# Altium footprint library ref-packages.PCBLIB: 1543 footprints (part 44 of 103)
Each footprint in its own frame and in the unit in brackets; x right, y up, seen from the top. Pads: shape width x height; smd on the part's side, far side on the other; paste and mask are expansions set on the pad; w line width, h text height; cw(c..) or ccw(c..) is an arc to the next point about the centre after c.
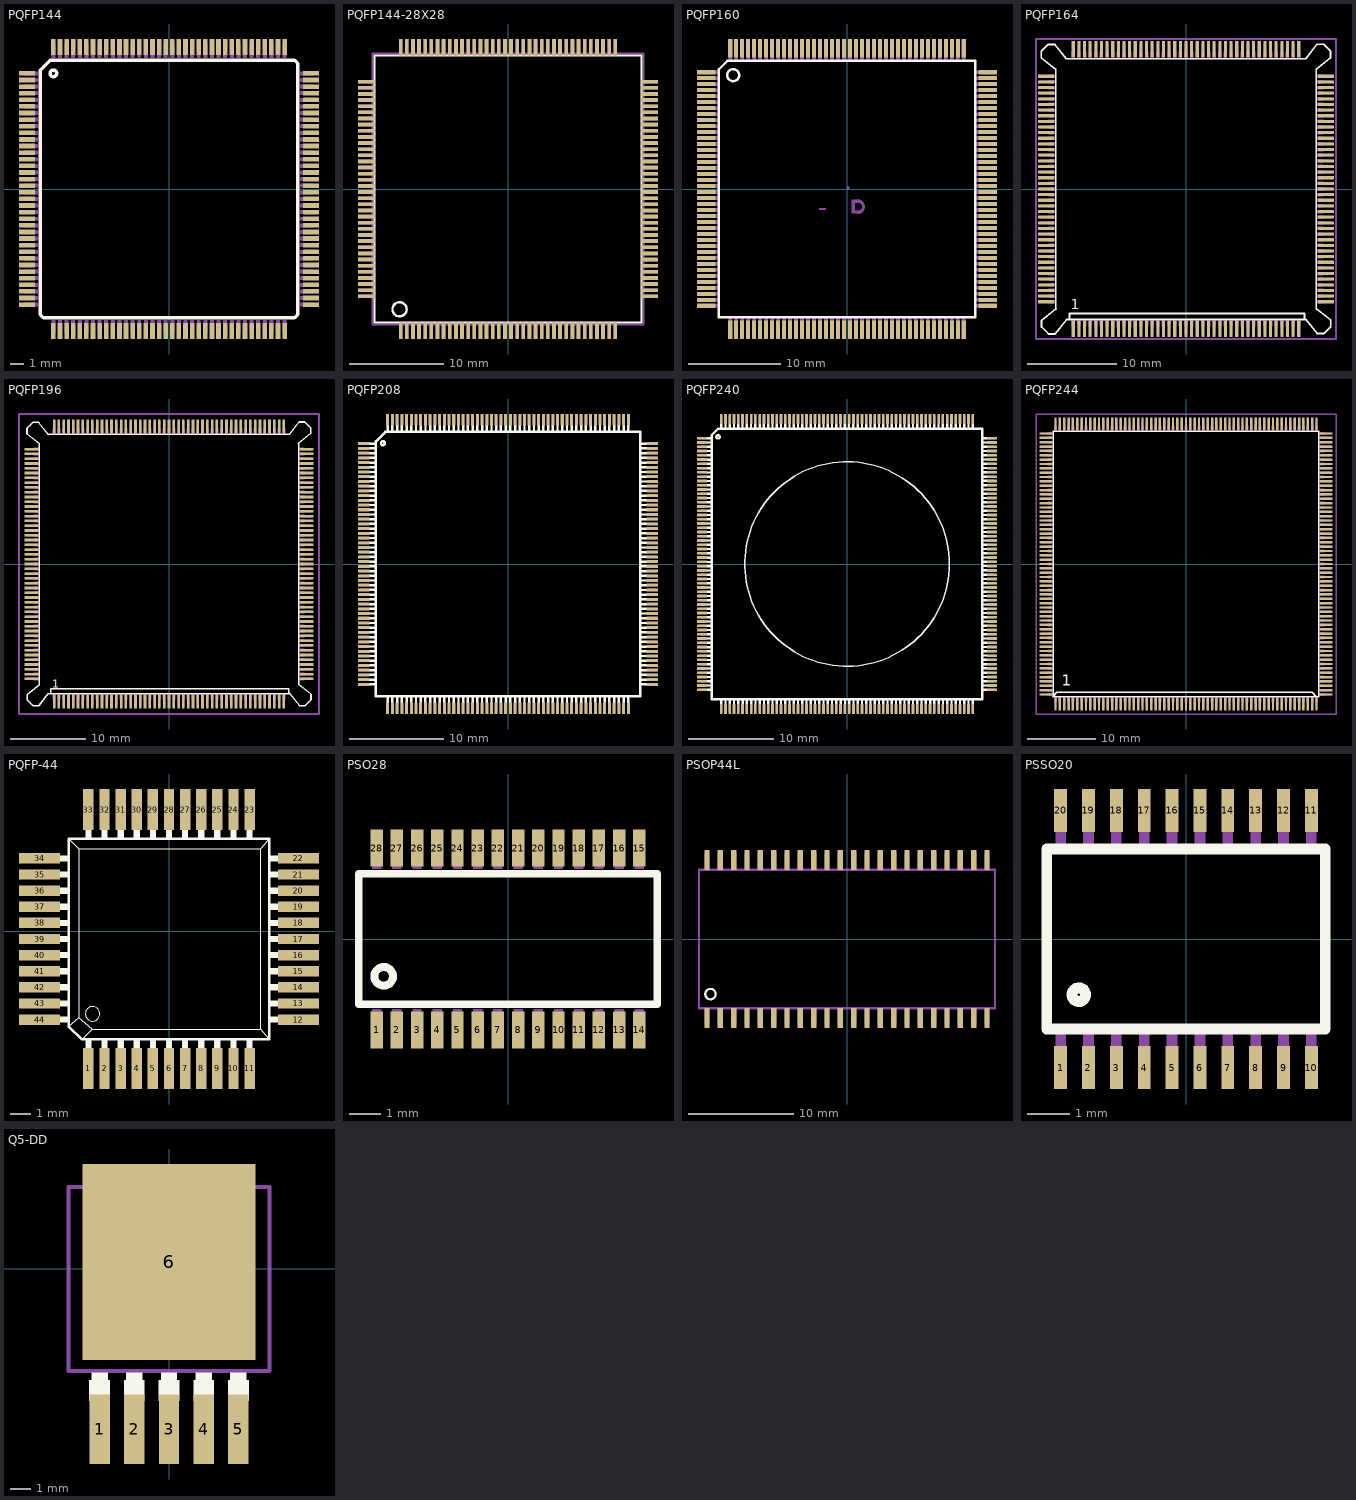
[diagram p43: the footprints below, top view; thin cyan lines are the x and y axes]

## PQFP144 [mm]
pads (144):
  rect 1.2x0.35 smd: 1(-10.75,8.75) 2(-10.75,8.25) 3(-10.75,7.75) 4(-10.75,7.25) 5(-10.75,6.75) 6(-10.75,6.25) 7(-10.75,5.75) 8(-10.75,5.25) 9(-10.75,4.75) 10(-10.75,4.25) 11(-10.75,3.75) 12(-10.75,3.25) 13(-10.75,2.75) 14(-10.75,2.25) 15(-10.75,1.75) 16(-10.75,1.25) 17(-10.75,0.75) 18(-10.75,0.25) 19(-10.75,-0.25) 20(-10.75,-0.75) 21(-10.75,-1.25) 22(-10.75,-1.75) 23(-10.75,-2.25) 24(-10.75,-2.75) 25(-10.75,-3.25) 26(-10.75,-3.75) 27(-10.75,-4.25) 28(-10.75,-4.75) 29(-10.75,-5.25) 30(-10.75,-5.75) 31(-10.75,-6.25) 32(-10.75,-6.75) 33(-10.75,-7.25) 34(-10.75,-7.75) 35(-10.75,-8.25) 36(-10.75,-8.75) 73(10.75,-8.75) 74(10.75,-8.25) 75(10.75,-7.75) 76(10.75,-7.25) 77(10.75,-6.75) 78(10.75,-6.25) 79(10.75,-5.75) 80(10.75,-5.25) 81(10.75,-4.75) 82(10.75,-4.25) 83(10.75,-3.75) 84(10.75,-3.25) 85(10.75,-2.75) 86(10.75,-2.25) 87(10.75,-1.75) 88(10.75,-1.25) 89(10.75,-0.75) 90(10.75,-0.25) 91(10.75,0.25) 92(10.75,0.75) 93(10.75,1.25) 94(10.75,1.75) 95(10.75,2.25) 96(10.75,2.75) 97(10.75,3.25) 98(10.75,3.75) 99(10.75,4.25) 100(10.75,4.75) 101(10.75,5.25) 102(10.75,5.75) 103(10.75,6.25) 104(10.75,6.75) 105(10.75,7.25) 106(10.75,7.75) 107(10.75,8.25) 108(10.75,8.75)
  rect 0.35x1.2 smd: 37(-8.75,-10.75) 38(-8.25,-10.75) 39(-7.75,-10.75) 40(-7.25,-10.75) 41(-6.75,-10.75) 42(-6.25,-10.75) 43(-5.75,-10.75) 44(-5.25,-10.75) 45(-4.75,-10.75) 46(-4.25,-10.75) 47(-3.75,-10.75) 48(-3.25,-10.75) 49(-2.75,-10.75) 50(-2.25,-10.75) 51(-1.75,-10.75) 52(-1.25,-10.75) 53(-0.75,-10.75) 54(-0.25,-10.75) 55(0.25,-10.75) 56(0.75,-10.75) 57(1.25,-10.75) 58(1.75,-10.75) 59(2.25,-10.75) 60(2.75,-10.75) 61(3.25,-10.75) 62(3.75,-10.75) 63(4.25,-10.75) 64(4.75,-10.75) 65(5.25,-10.75) 66(5.75,-10.75) 67(6.25,-10.75) 68(6.75,-10.75) 69(7.25,-10.75) 70(7.75,-10.75) 71(8.25,-10.75) 72(8.75,-10.75) 109(8.75,10.75) 110(8.25,10.75) 111(7.75,10.75) 112(7.25,10.75) 113(6.75,10.75) 114(6.25,10.75) 115(5.75,10.75) 116(5.25,10.75) 117(4.75,10.75) 118(4.25,10.75) 119(3.75,10.75) 120(3.25,10.75) 121(2.75,10.75) 122(2.25,10.75) 123(1.75,10.75) 124(1.25,10.75) 125(0.75,10.75) 126(0.25,10.75) 127(-0.25,10.75) 128(-0.75,10.75) 129(-1.25,10.75) 130(-1.75,10.75) 131(-2.25,10.75) 132(-2.75,10.75) 133(-3.25,10.75) 134(-3.75,10.75) 135(-4.25,10.75) 136(-4.75,10.75) 137(-5.25,10.75) 138(-5.75,10.75) 139(-6.25,10.75) 140(-6.75,10.75) 141(-7.25,10.75) 142(-7.75,10.75) 143(-8.25,10.75) 144(-8.75,10.75)
Top Overlay:
  circle w0.254: c-8.75,8.75 r0.25
  lines w0.254: -9.75,-9.5 -9.5,-9.75 9.5,-9.75 9.75,-9.5 9.75,9.5 9.5,9.75 -9,9.75 -9.75,9 -9.75,-9.5
Mechanical 16:
  rectangle: -10.95,8.6 -9.9,8.9
  rectangle: -10.95,8.1 -9.9,8.4
  rectangle: -10.95,7.6 -9.9,7.9
  rectangle: -10.95,7.1 -9.9,7.4
  rectangle: -10.95,6.6 -9.9,6.9
  rectangle: -10.95,6.1 -9.9,6.4
  rectangle: -10.95,5.6 -9.9,5.9
  rectangle: -10.95,5.1 -9.9,5.4
  rectangle: -10.95,4.6 -9.9,4.9
  rectangle: -10.95,4.1 -9.9,4.4
  rectangle: -10.95,3.6 -9.9,3.9
  rectangle: -10.95,3.1 -9.9,3.4
  rectangle: -10.95,2.6 -9.9,2.9
  rectangle: -10.95,2.1 -9.9,2.4
  rectangle: -10.95,1.6 -9.9,1.9
  rectangle: -10.95,1.1 -9.9,1.4
  rectangle: -10.95,0.6 -9.9,0.9
  rectangle: -10.95,0.1 -9.9,0.4
  rectangle: -10.95,-0.4 -9.9,-0.1
  rectangle: -10.95,-0.9 -9.9,-0.6
  rectangle: -10.95,-1.4 -9.9,-1.1
  rectangle: -10.95,-1.9 -9.9,-1.6
  rectangle: -10.95,-2.4 -9.9,-2.1
  rectangle: -10.95,-2.9 -9.9,-2.6
  rectangle: -10.95,-3.4 -9.9,-3.1
  rectangle: -10.95,-3.9 -9.9,-3.6
  rectangle: -10.95,-4.4 -9.9,-4.1
  rectangle: -10.95,-4.9 -9.9,-4.6
  rectangle: -10.95,-5.4 -9.9,-5.1
  rectangle: -10.95,-5.9 -9.9,-5.6
  rectangle: -10.95,-6.4 -9.9,-6.1
  rectangle: -10.95,-6.9 -9.9,-6.6
  rectangle: -10.95,-7.4 -9.9,-7.1
  rectangle: -10.95,-7.9 -9.9,-7.6
  rectangle: -10.95,-8.4 -9.9,-8.1
  rectangle: -10.95,-8.9 -9.9,-8.6
  rectangle: -8.9,-10.95 -8.6,-9.9
  rectangle: -8.4,-10.95 -8.1,-9.9
  rectangle: -7.9,-10.95 -7.6,-9.9
  rectangle: -7.4,-10.95 -7.1,-9.9
  rectangle: -6.9,-10.95 -6.6,-9.9
  rectangle: -6.4,-10.95 -6.1,-9.9
  rectangle: -5.9,-10.95 -5.6,-9.9
  rectangle: -5.4,-10.95 -5.1,-9.9
  rectangle: -4.9,-10.95 -4.6,-9.9
  rectangle: -4.4,-10.95 -4.1,-9.9
  rectangle: -3.9,-10.95 -3.6,-9.9
  rectangle: -3.4,-10.95 -3.1,-9.9
  rectangle: -2.9,-10.95 -2.6,-9.9
  rectangle: -2.4,-10.95 -2.1,-9.9
  rectangle: -1.9,-10.95 -1.6,-9.9
  rectangle: -1.4,-10.95 -1.1,-9.9
  rectangle: -0.9,-10.95 -0.6,-9.9
  rectangle: -0.4,-10.95 -0.1,-9.9
  rectangle: 0.1,-10.95 0.4,-9.9
  rectangle: 0.6,-10.95 0.9,-9.9
  rectangle: 1.1,-10.95 1.4,-9.9
  rectangle: 1.6,-10.95 1.9,-9.9
  rectangle: 2.1,-10.95 2.4,-9.9
  rectangle: 2.6,-10.95 2.9,-9.9
  rectangle: 3.1,-10.95 3.4,-9.9
  rectangle: 3.6,-10.95 3.9,-9.9
  rectangle: 4.1,-10.95 4.4,-9.9
  rectangle: 4.6,-10.95 4.9,-9.9
  rectangle: 5.1,-10.95 5.4,-9.9
  rectangle: 5.6,-10.95 5.9,-9.9
  rectangle: 6.1,-10.95 6.4,-9.9
  rectangle: 6.6,-10.95 6.9,-9.9
  rectangle: 7.1,-10.95 7.4,-9.9
  rectangle: 7.6,-10.95 7.9,-9.9
  rectangle: 8.1,-10.95 8.4,-9.9
  rectangle: 8.6,-10.95 8.9,-9.9
  rectangle: 9.9,-8.9 10.95,-8.6
  rectangle: 9.9,-8.4 10.95,-8.1
  rectangle: 9.9,-7.9 10.95,-7.6
  rectangle: 9.9,-7.4 10.95,-7.1
  rectangle: 9.9,-6.9 10.95,-6.6
  rectangle: 9.9,-6.4 10.95,-6.1
  rectangle: 9.9,-5.9 10.95,-5.6
  rectangle: 9.9,-5.4 10.95,-5.1
  rectangle: 9.9,-4.9 10.95,-4.6
  rectangle: 9.9,-4.4 10.95,-4.1
  rectangle: 9.9,-3.9 10.95,-3.6
  rectangle: 9.9,-3.4 10.95,-3.1
  rectangle: 9.9,-2.9 10.95,-2.6
  rectangle: 9.9,-2.4 10.95,-2.1
  rectangle: 9.9,-1.9 10.95,-1.6
  rectangle: 9.9,-1.4 10.95,-1.1
  rectangle: 9.9,-0.9 10.95,-0.6
  rectangle: 9.9,-0.4 10.95,-0.1
  rectangle: 9.9,0.1 10.95,0.4
  rectangle: 9.9,0.6 10.95,0.9
  rectangle: 9.9,1.1 10.95,1.4
  rectangle: 9.9,1.6 10.95,1.9
  rectangle: 9.9,2.1 10.95,2.4
  rectangle: 9.9,2.6 10.95,2.9
  rectangle: 9.9,3.1 10.95,3.4
  rectangle: 9.9,3.6 10.95,3.9
  rectangle: 9.9,4.1 10.95,4.4
  rectangle: 9.9,4.6 10.95,4.9
  rectangle: 9.9,5.1 10.95,5.4
  rectangle: 9.9,5.6 10.95,5.9
  rectangle: 9.9,6.1 10.95,6.4
  rectangle: 9.9,6.6 10.95,6.9
  rectangle: 9.9,7.1 10.95,7.4
  rectangle: 9.9,7.6 10.95,7.9
  rectangle: 9.9,8.1 10.95,8.4
  rectangle: 9.9,8.6 10.95,8.9
  rectangle: 8.6,9.9 8.9,10.95
  rectangle: 8.1,9.9 8.4,10.95
  rectangle: 7.6,9.9 7.9,10.95
  rectangle: 7.1,9.9 7.4,10.95
  rectangle: 6.6,9.9 6.9,10.95
  rectangle: 6.1,9.9 6.4,10.95
  rectangle: 5.6,9.9 5.9,10.95
  rectangle: 5.1,9.9 5.4,10.95
  rectangle: 4.6,9.9 4.9,10.95
  rectangle: 4.1,9.9 4.4,10.95
  rectangle: 3.6,9.9 3.9,10.95
  rectangle: 3.1,9.9 3.4,10.95
  rectangle: 2.6,9.9 2.9,10.95
  rectangle: 2.1,9.9 2.4,10.95
  rectangle: 1.6,9.9 1.9,10.95
  rectangle: 1.1,9.9 1.4,10.95
  rectangle: 0.6,9.9 0.9,10.95
  rectangle: 0.1,9.9 0.4,10.95
  rectangle: -0.4,9.9 -0.1,10.95
  rectangle: -0.9,9.9 -0.6,10.95
  rectangle: -1.4,9.9 -1.1,10.95
  rectangle: -1.9,9.9 -1.6,10.95
  rectangle: -2.4,9.9 -2.1,10.95
  rectangle: -2.9,9.9 -2.6,10.95
  rectangle: -3.4,9.9 -3.1,10.95
  rectangle: -3.9,9.9 -3.6,10.95
  rectangle: -4.4,9.9 -4.1,10.95
  rectangle: -4.9,9.9 -4.6,10.95
  rectangle: -5.4,9.9 -5.1,10.95
  rectangle: -5.9,9.9 -5.6,10.95
  rectangle: -6.4,9.9 -6.1,10.95
  rectangle: -6.9,9.9 -6.6,10.95
  rectangle: -7.4,9.9 -7.1,10.95
  rectangle: -7.9,9.9 -7.6,10.95
  rectangle: -8.4,9.9 -8.1,10.95
  rectangle: -8.9,9.9 -8.6,10.95
  text "PGE(S-PQFP-G144)" at -3.81,-8.23 h0.94

## PQFP144-28X28 [mm]
pads (144):
  rect 0.4x1.8 smd: 1(-11.375,-15) 2(-10.725,-15) 3(-10.075,-15) 4(-9.425,-15) 5(-8.775,-15) 6(-8.125,-15) 7(-7.475,-15) 8(-6.825,-15) 9(-6.175,-15) 10(-5.525,-15) 11(-4.875,-15) 12(-4.225,-15) 13(-3.575,-15) 14(-2.925,-15) 15(-2.275,-15) 16(-1.625,-15) 17(-0.975,-15) 18(-0.325,-15) 19(0.325,-15) 20(0.975,-15) 21(1.625,-15) 22(2.275,-15) 23(2.925,-15) 24(3.575,-15) 25(4.225,-15) 26(4.875,-15) 27(5.525,-15) 28(6.175,-15) 29(6.825,-15) 30(7.475,-15) 31(8.125,-15) 32(8.775,-15) 33(9.425,-15) 34(10.075,-15) 35(10.725,-15) 36(11.375,-15) 73(11.375,15) 74(10.725,15) 75(10.075,15) 76(9.425,15) 77(8.775,15) 78(8.125,15) 79(7.475,15) 80(6.825,15) 81(6.175,15) 82(5.525,15) 83(4.875,15) 84(4.225,15) 85(3.575,15) 86(2.925,15) 87(2.275,15) 88(1.625,15) 89(0.975,15) 90(0.325,15) 91(-0.325,15) 92(-0.975,15) 93(-1.625,15) 94(-2.275,15) 95(-2.925,15) 96(-3.575,15) 97(-4.225,15) 98(-4.875,15) 99(-5.525,15) 100(-6.175,15) 101(-6.825,15) 102(-7.475,15) 103(-8.125,15) 104(-8.775,15) 105(-9.425,15) 106(-10.075,15) 107(-10.725,15) 108(-11.375,15)
  rect 1.8x0.4 smd: 37(15,-11.375) 38(15,-10.725) 39(15,-10.075) 40(15,-9.425) 41(15,-8.775) 42(15,-8.125) 43(15,-7.475) 44(15,-6.825) 45(15,-6.175) 46(15,-5.525) 47(15,-4.875) 48(15,-4.225) 49(15,-3.575) 50(15,-2.925) 51(15,-2.275) 52(15,-1.625) 53(15,-0.975) 54(15,-0.325) 55(15,0.325) 56(15,0.975) 57(15,1.625) 58(15,2.275) 59(15,2.925) 60(15,3.575) 61(15,4.225) 62(15,4.875) 63(15,5.525) 64(15,6.175) 65(15,6.825) 66(15,7.475) 67(15,8.125) 68(15,8.775) 69(15,9.425) 70(15,10.075) 71(15,10.725) 72(15,11.375) 109(-15,11.375) 110(-15,10.725) 111(-15,10.075) 112(-15,9.425) 113(-15,8.775) 114(-15,8.125) 115(-15,7.475) 116(-15,6.825) 117(-15,6.175) 118(-15,5.525) 119(-15,4.875) 120(-15,4.225) 121(-15,3.575) 122(-15,2.925) 123(-15,2.275) 124(-15,1.625) 125(-15,0.975) 126(-15,0.325) 127(-15,-0.325) 128(-15,-0.975) 129(-15,-1.625) 130(-15,-2.275) 131(-15,-2.925) 132(-15,-3.575) 133(-15,-4.225) 134(-15,-4.875) 135(-15,-5.525) 136(-15,-6.175) 137(-15,-6.825) 138(-15,-7.475) 139(-15,-8.125) 140(-15,-8.775) 141(-15,-9.425) 142(-15,-10.075) 143(-15,-10.725) 144(-15,-11.375)
Top Overlay:
  circle w0.254: c-11.5,-12.75 r0.75
  lines w0.203: -14.17,-14.16 14.16,-14.16 14.16,14.16 -14.17,14.16 -14.17,-14.16
Mechanical 16:
  rectangle: -11.565,-15.9 -11.195,-14.45
  rectangle: -10.915,-15.9 -10.545,-14.45
  rectangle: -10.265,-15.9 -9.895,-14.45
  rectangle: -9.615,-15.9 -9.245,-14.45
  rectangle: -8.965,-15.9 -8.595,-14.45
  rectangle: -8.315,-15.9 -7.945,-14.45
  rectangle: -7.665,-15.9 -7.295,-14.45
  rectangle: -7.015,-15.9 -6.645,-14.45
  rectangle: -6.365,-15.9 -5.995,-14.45
  rectangle: -5.715,-15.9 -5.345,-14.45
  rectangle: -5.065,-15.9 -4.695,-14.45
  rectangle: -4.415,-15.9 -4.045,-14.45
  rectangle: -3.765,-15.9 -3.395,-14.45
  rectangle: -3.115,-15.9 -2.745,-14.45
  rectangle: -2.465,-15.9 -2.095,-14.45
  rectangle: -1.815,-15.9 -1.445,-14.45
  rectangle: -1.165,-15.9 -0.795,-14.45
  rectangle: -0.515,-15.9 -0.145,-14.45
  rectangle: 0.135,-15.9 0.505,-14.45
  rectangle: 0.785,-15.9 1.155,-14.45
  rectangle: 1.435,-15.9 1.805,-14.45
  rectangle: 2.085,-15.9 2.455,-14.45
  rectangle: 2.735,-15.9 3.105,-14.45
  rectangle: 3.385,-15.9 3.755,-14.45
  rectangle: 4.035,-15.9 4.405,-14.45
  rectangle: 4.685,-15.9 5.055,-14.45
  rectangle: 5.335,-15.9 5.705,-14.45
  rectangle: 5.985,-15.9 6.355,-14.45
  rectangle: 6.635,-15.9 7.005,-14.45
  rectangle: 7.285,-15.9 7.655,-14.45
  rectangle: 7.935,-15.9 8.305,-14.45
  rectangle: 8.585,-15.9 8.955,-14.45
  rectangle: 9.235,-15.9 9.605,-14.45
  rectangle: 9.885,-15.9 10.255,-14.45
  rectangle: 10.535,-15.9 10.905,-14.45
  rectangle: 11.185,-15.9 11.555,-14.45
  rectangle: 14.45,-11.565 15.9,-11.195
  rectangle: 14.45,-10.915 15.9,-10.545
  rectangle: 14.45,-10.265 15.9,-9.895
  rectangle: 14.45,-9.615 15.9,-9.245
  rectangle: 14.45,-8.965 15.9,-8.595
  rectangle: 14.45,-8.315 15.9,-7.945
  rectangle: 14.45,-7.665 15.9,-7.295
  rectangle: 14.45,-7.015 15.9,-6.645
  rectangle: 14.45,-6.365 15.9,-5.995
  rectangle: 14.45,-5.715 15.9,-5.345
  rectangle: 14.45,-5.065 15.9,-4.695
  rectangle: 14.45,-4.415 15.9,-4.045
  rectangle: 14.45,-3.765 15.9,-3.395
  rectangle: 14.45,-3.115 15.9,-2.745
  rectangle: 14.45,-2.465 15.9,-2.095
  rectangle: 14.45,-1.815 15.9,-1.445
  rectangle: 14.45,-1.165 15.9,-0.795
  rectangle: 14.45,-0.515 15.9,-0.145
  rectangle: 14.45,0.135 15.9,0.505
  rectangle: 14.45,0.785 15.9,1.155
  rectangle: 14.45,1.435 15.9,1.805
  rectangle: 14.45,2.085 15.9,2.455
  rectangle: 14.45,2.735 15.9,3.105
  rectangle: 14.45,3.385 15.9,3.755
  rectangle: 14.45,4.035 15.9,4.405
  rectangle: 14.45,4.685 15.9,5.055
  rectangle: 14.45,5.335 15.9,5.705
  rectangle: 14.45,5.985 15.9,6.355
  rectangle: 14.45,6.635 15.9,7.005
  rectangle: 14.45,7.285 15.9,7.655
  rectangle: 14.45,7.935 15.9,8.305
  rectangle: 14.45,8.585 15.9,8.955
  rectangle: 14.45,9.235 15.9,9.605
  rectangle: 14.45,9.885 15.9,10.255
  rectangle: 14.45,10.535 15.9,10.905
  rectangle: 14.45,11.185 15.9,11.555
  rectangle: 11.195,14.45 11.565,15.9
  rectangle: 10.545,14.45 10.915,15.9
  rectangle: 9.895,14.45 10.265,15.9
  rectangle: 9.245,14.45 9.615,15.9
  rectangle: 8.595,14.45 8.965,15.9
  rectangle: 7.945,14.45 8.315,15.9
  rectangle: 7.295,14.45 7.665,15.9
  rectangle: 6.645,14.45 7.015,15.9
  rectangle: 5.995,14.45 6.365,15.9
  rectangle: 5.345,14.45 5.715,15.9
  rectangle: 4.695,14.45 5.065,15.9
  rectangle: 4.045,14.45 4.415,15.9
  rectangle: 3.395,14.45 3.765,15.9
  rectangle: 2.745,14.45 3.115,15.9
  rectangle: 2.095,14.45 2.465,15.9
  rectangle: 1.445,14.45 1.815,15.9
  rectangle: 0.795,14.45 1.165,15.9
  rectangle: 0.145,14.45 0.515,15.9
  rectangle: -0.505,14.45 -0.135,15.9
  rectangle: -1.155,14.45 -0.785,15.9
  rectangle: -1.805,14.45 -1.435,15.9
  rectangle: -2.455,14.45 -2.085,15.9
  rectangle: -3.105,14.45 -2.735,15.9
  rectangle: -3.755,14.45 -3.385,15.9
  rectangle: -4.405,14.45 -4.035,15.9
  rectangle: -5.055,14.45 -4.685,15.9
  rectangle: -5.705,14.45 -5.335,15.9
  rectangle: -6.355,14.45 -5.985,15.9
  rectangle: -7.005,14.45 -6.635,15.9
  rectangle: -7.655,14.45 -7.285,15.9
  rectangle: -8.305,14.45 -7.935,15.9
  rectangle: -8.955,14.45 -8.585,15.9
  rectangle: -9.605,14.45 -9.235,15.9
  rectangle: -10.255,14.45 -9.885,15.9
  rectangle: -10.905,14.45 -10.535,15.9
  rectangle: -11.555,14.45 -11.185,15.9
  rectangle: -15.9,11.195 -14.45,11.565
  rectangle: -15.9,10.545 -14.45,10.915
  rectangle: -15.9,9.895 -14.45,10.265
  rectangle: -15.9,9.245 -14.45,9.615
  rectangle: -15.9,8.595 -14.45,8.965
  rectangle: -15.9,7.945 -14.45,8.315
  rectangle: -15.9,7.295 -14.45,7.665
  rectangle: -15.9,6.645 -14.45,7.015
  rectangle: -15.9,5.995 -14.45,6.365
  rectangle: -15.9,5.345 -14.45,5.715
  rectangle: -15.9,4.695 -14.45,5.065
  rectangle: -15.9,4.045 -14.45,4.415
  rectangle: -15.9,3.395 -14.45,3.765
  rectangle: -15.9,2.745 -14.45,3.115
  rectangle: -15.9,2.095 -14.45,2.465
  rectangle: -15.9,1.445 -14.45,1.815
  rectangle: -15.9,0.795 -14.45,1.165
  rectangle: -15.9,0.145 -14.45,0.515
  rectangle: -15.9,-0.505 -14.45,-0.135
  rectangle: -15.9,-1.155 -14.45,-0.785
  rectangle: -15.9,-1.805 -14.45,-1.435
  rectangle: -15.9,-2.455 -14.45,-2.085
  rectangle: -15.9,-3.105 -14.45,-2.735
  rectangle: -15.9,-3.755 -14.45,-3.385
  rectangle: -15.9,-4.405 -14.45,-4.035
  rectangle: -15.9,-5.055 -14.45,-4.685
  rectangle: -15.9,-5.705 -14.45,-5.335
  rectangle: -15.9,-6.355 -14.45,-5.985
  rectangle: -15.9,-7.005 -14.45,-6.635
  rectangle: -15.9,-7.655 -14.45,-7.285
  rectangle: -15.9,-8.305 -14.45,-7.935
  rectangle: -15.9,-8.955 -14.45,-8.585
  rectangle: -15.9,-9.605 -14.45,-9.235
  rectangle: -15.9,-10.255 -14.45,-9.885
  rectangle: -15.9,-10.905 -14.45,-10.535
  rectangle: -15.9,-11.555 -14.45,-11.185
  lines w0.203: -14.36,-14.36 14.36,-14.36 14.36,14.36 -14.36,14.36 -14.36,-14.36

## PQFP160 [mm]
pads (160):
  rect 2x0.45 smd: 1(-15.275,12.675) 2(-15.275,12.025) 3(-15.275,11.375) 4(-15.275,10.725) 5(-15.275,10.075) 6(-15.275,9.425) 7(-15.275,8.775) 8(-15.275,8.125) 9(-15.275,7.475) 10(-15.275,6.825) 11(-15.275,6.175) 12(-15.275,5.525) 13(-15.275,4.875) 14(-15.275,4.225) 15(-15.275,3.575) 16(-15.275,2.925) 17(-15.275,2.275) 18(-15.275,1.625) 19(-15.275,0.975) 20(-15.275,0.325) 21(-15.275,-0.325) 22(-15.275,-0.975) 23(-15.275,-1.625) 24(-15.275,-2.275) 25(-15.275,-2.925) 26(-15.275,-3.575) 27(-15.275,-4.225) 28(-15.275,-4.875) 29(-15.275,-5.525) 30(-15.275,-6.175) 31(-15.275,-6.825) 32(-15.275,-7.475) 33(-15.275,-8.125) 34(-15.275,-8.775) 35(-15.275,-9.425) 36(-15.275,-10.075) 37(-15.275,-10.725) 38(-15.275,-11.375) 39(-15.275,-12.025) 40(-15.275,-12.675) 81(15.275,-12.675) 82(15.275,-12.025) 83(15.275,-11.375) 84(15.275,-10.725) 85(15.275,-10.075) 86(15.275,-9.425) 87(15.275,-8.775) 88(15.275,-8.125) 89(15.275,-7.475) 90(15.275,-6.825) 91(15.275,-6.175) 92(15.275,-5.525) 93(15.275,-4.875) 94(15.275,-4.225) 95(15.275,-3.575) 96(15.275,-2.925) 97(15.275,-2.275) 98(15.275,-1.625) 99(15.275,-0.975) 100(15.275,-0.325) 101(15.275,0.325) 102(15.275,0.975) 103(15.275,1.625) 104(15.275,2.275) 105(15.275,2.925) 106(15.275,3.575) 107(15.275,4.225) 108(15.275,4.875) 109(15.275,5.525) 110(15.275,6.175) 111(15.275,6.825) 112(15.275,7.475) 113(15.275,8.125) 114(15.275,8.775) 115(15.275,9.425) 116(15.275,10.075) 117(15.275,10.725) 118(15.275,11.375) 119(15.275,12.025) 120(15.275,12.675)
  rect 0.45x2 smd: 41(-12.675,-15.275) 42(-12.025,-15.275) 43(-11.375,-15.275) 44(-10.725,-15.275) 45(-10.075,-15.275) 46(-9.425,-15.275) 47(-8.775,-15.275) 48(-8.125,-15.275) 49(-7.475,-15.275) 50(-6.825,-15.275) 51(-6.175,-15.275) 52(-5.525,-15.275) 53(-4.875,-15.275) 54(-4.225,-15.275) 55(-3.575,-15.275) 56(-2.925,-15.275) 57(-2.275,-15.275) 58(-1.625,-15.275) 59(-0.975,-15.275) 60(-0.325,-15.275) 61(0.325,-15.275) 62(0.975,-15.275) 63(1.625,-15.275) 64(2.275,-15.275) 65(2.925,-15.275) 66(3.575,-15.275) 67(4.225,-15.275) 68(4.875,-15.275) 69(5.525,-15.275) 70(6.175,-15.275) 71(6.825,-15.275) 72(7.475,-15.275) 73(8.125,-15.275) 74(8.775,-15.275) 75(9.425,-15.275) 76(10.075,-15.275) 77(10.725,-15.275) 78(11.375,-15.275) 79(12.025,-15.275) 80(12.675,-15.275) 121(12.675,15.275) 122(12.025,15.275) 123(11.375,15.275) 124(10.725,15.275) 125(10.075,15.275) 126(9.425,15.275) 127(8.775,15.275) 128(8.125,15.275) 129(7.475,15.275) 130(6.825,15.275) 131(6.175,15.275) 132(5.525,15.275) 133(4.875,15.275) 134(4.225,15.275) 135(3.575,15.275) 136(2.925,15.275) 137(2.275,15.275) 138(1.625,15.275) 139(0.975,15.275) 140(0.325,15.275) 141(-0.325,15.275) 142(-0.975,15.275) 143(-1.625,15.275) 144(-2.275,15.275) 145(-2.925,15.275) 146(-3.575,15.275) 147(-4.225,15.275) 148(-4.875,15.275) 149(-5.525,15.275) 150(-6.175,15.275) 151(-6.825,15.275) 152(-7.475,15.275) 153(-8.125,15.275) 154(-8.775,15.275) 155(-9.425,15.275) 156(-10.075,15.275) 157(-10.725,15.275) 158(-11.375,15.275) 159(-12.025,15.275) 160(-12.675,15.275)
Top Overlay:
  circle w0.254: c-12.35,12.35 r0.65
  lines w0.254: -13.9,-13.9 13.9,-13.9 13.9,13.9 -13,13.9 -13.9,13 -13.9,-13.9
Mechanical 16:
  drawing of 173 lines, arcs and shapes, not listed
  text "PQFP 160" at -3.96,-9.81 h1.26

## PQFP164 [mm]
pads (164):
  rect 0.35x1.8 smd: 1(-12.7,-15.8) 2(-12.065,-15.8) 3(-11.43,-15.8) 4(-10.795,-15.8) 5(-10.16,-15.8) 6(-9.525,-15.8) 7(-8.89,-15.8) 8(-8.255,-15.8) 9(-7.62,-15.8) 10(-6.985,-15.8) 11(-6.35,-15.8) 12(-5.715,-15.8) 13(-5.08,-15.8) 14(-4.445,-15.8) 15(-3.81,-15.8) 16(-3.175,-15.8) 17(-2.54,-15.8) 18(-1.905,-15.8) 19(-1.27,-15.8) 20(-0.635,-15.8) 21(0,-15.8) 22(0.635,-15.8) 23(1.27,-15.8) 24(1.905,-15.8) 25(2.54,-15.8) 26(3.175,-15.8) 27(3.81,-15.8) 28(4.445,-15.8) 29(5.08,-15.8) 30(5.715,-15.8) 31(6.35,-15.8) 32(6.985,-15.8) 33(7.62,-15.8) 34(8.255,-15.8) 35(8.89,-15.8) 36(9.525,-15.8) 37(10.16,-15.8) 38(10.795,-15.8) 39(11.43,-15.8) 40(12.065,-15.8) 41(12.7,-15.8) 83(12.7,15.8) 84(12.065,15.8) 85(11.43,15.8) 86(10.795,15.8) 87(10.16,15.8) 88(9.525,15.8) 89(8.89,15.8) 90(8.255,15.8) 91(7.62,15.8) 92(6.985,15.8) 93(6.35,15.8) 94(5.715,15.8) 95(5.08,15.8) 96(4.445,15.8) 97(3.81,15.8) 98(3.175,15.8) 99(2.54,15.8) 100(1.905,15.8) 101(1.27,15.8) 102(0.635,15.8) 103(0,15.8) 104(-0.635,15.8) 105(-1.27,15.8) 106(-1.905,15.8) 107(-2.54,15.8) 108(-3.175,15.8) 109(-3.81,15.8) 110(-4.445,15.8) 111(-5.08,15.8) 112(-5.715,15.8) 113(-6.35,15.8) 114(-6.985,15.8) 115(-7.62,15.8) 116(-8.255,15.8) 117(-8.89,15.8) 118(-9.525,15.8) 119(-10.16,15.8) 120(-10.795,15.8) 121(-11.43,15.8) 122(-12.065,15.8) 123(-12.7,15.8)
  rect 1.8x0.35 smd: 42(15.8,-12.7) 43(15.8,-12.065) 44(15.8,-11.43) 45(15.8,-10.795) 46(15.8,-10.16) 47(15.8,-9.525) 48(15.8,-8.89) 49(15.8,-8.255) 50(15.8,-7.62) 51(15.8,-6.985) 52(15.8,-6.35) 53(15.8,-5.715) 54(15.8,-5.08) 55(15.8,-4.445) 56(15.8,-3.81) 57(15.8,-3.175) 58(15.8,-2.54) 59(15.8,-1.905) 60(15.8,-1.27) 61(15.8,-0.635) 62(15.8,0) 63(15.8,0.635) 64(15.8,1.27) 65(15.8,1.905) 66(15.8,2.54) 67(15.8,3.175) 68(15.8,3.81) 69(15.8,4.445) 70(15.8,5.08) 71(15.8,5.715) 72(15.8,6.35) 73(15.8,6.985) 74(15.8,7.62) 75(15.8,8.255) 76(15.8,8.89) 77(15.8,9.525) 78(15.8,10.16) 79(15.8,10.795) 80(15.8,11.43) 81(15.8,12.065) 82(15.8,12.7) 124(-15.8,12.7) 125(-15.8,12.065) 126(-15.8,11.43) 127(-15.8,10.795) 128(-15.8,10.16) 129(-15.8,9.525) 130(-15.8,8.89) 131(-15.8,8.255) 132(-15.8,7.62) 133(-15.8,6.985) 134(-15.8,6.35) 135(-15.8,5.715) 136(-15.8,5.08) 137(-15.8,4.445) 138(-15.8,3.81) 139(-15.8,3.175) 140(-15.8,2.54) 141(-15.8,1.905) 142(-15.8,1.27) 143(-15.8,0.635) 144(-15.8,0) 145(-15.8,-0.635) 146(-15.8,-1.27) 147(-15.8,-1.905) 148(-15.8,-2.54) 149(-15.8,-3.175) 150(-15.8,-3.81) 151(-15.8,-4.445) 152(-15.8,-5.08) 153(-15.8,-5.715) 154(-15.8,-6.35) 155(-15.8,-6.985) 156(-15.8,-7.62) 157(-15.8,-8.255) 158(-15.8,-8.89) 159(-15.8,-9.525) 160(-15.8,-10.16) 161(-15.8,-10.795) 162(-15.8,-11.43) 163(-15.8,-12.065) 164(-15.8,-12.7)
Top Overlay:
  lines w0.203: -16.3,14.752 -16.3,15.514 ; -16.286,14.752 -14.68,13.482 ; -16.286,15.514 -15.524,16.29 -14.762,16.29 ; -16.27,-14.782 -16.27,-15.544 -15.494,-16.306 ; -16.256,-14.782 -14.65,-13.512 ; -15.494,-16.32 -14.732,-16.32 ; -14.762,16.276 -13.492,14.67 ; -14.732,-16.306 -13.462,-14.7 -13.126,-14.7 ; -14.68,-13.442 -14.68,13.4 ; -13.442,14.68 13.4,14.68 ; 13.335,-14.655 13.335,-14.02 -13.126,-14.02 -13.126,-14.7 ; 13.462,-14.7 -13.126,-14.7 ; 13.482,14.68 14.752,16.286 ; 13.492,-14.67 14.762,-16.276 ; 14.67,13.492 16.276,14.762 ; 14.68,-13.482 16.286,-14.752 ; 14.68,-13.4 14.68,13.442 ; 14.752,16.3 15.514,16.3 ; 14.762,-16.29 15.524,-16.29 16.286,-15.514 ; 15.514,16.286 16.29,15.524 16.29,14.762 ; 16.3,-15.514 16.3,-14.752